# Altium footprint library microbuilder.PCBLIB: 422 footprints (part 12 of 27)
Each footprint in its own frame and in the unit in brackets; x right, y up, seen from the top. Pads: shape width x height; smd on the part's side, far side on the other; paste and mask are expansions set on the pad; w line width, h text height; cw(c..) or ccw(c..) is an arc to the next point about the centre after c.
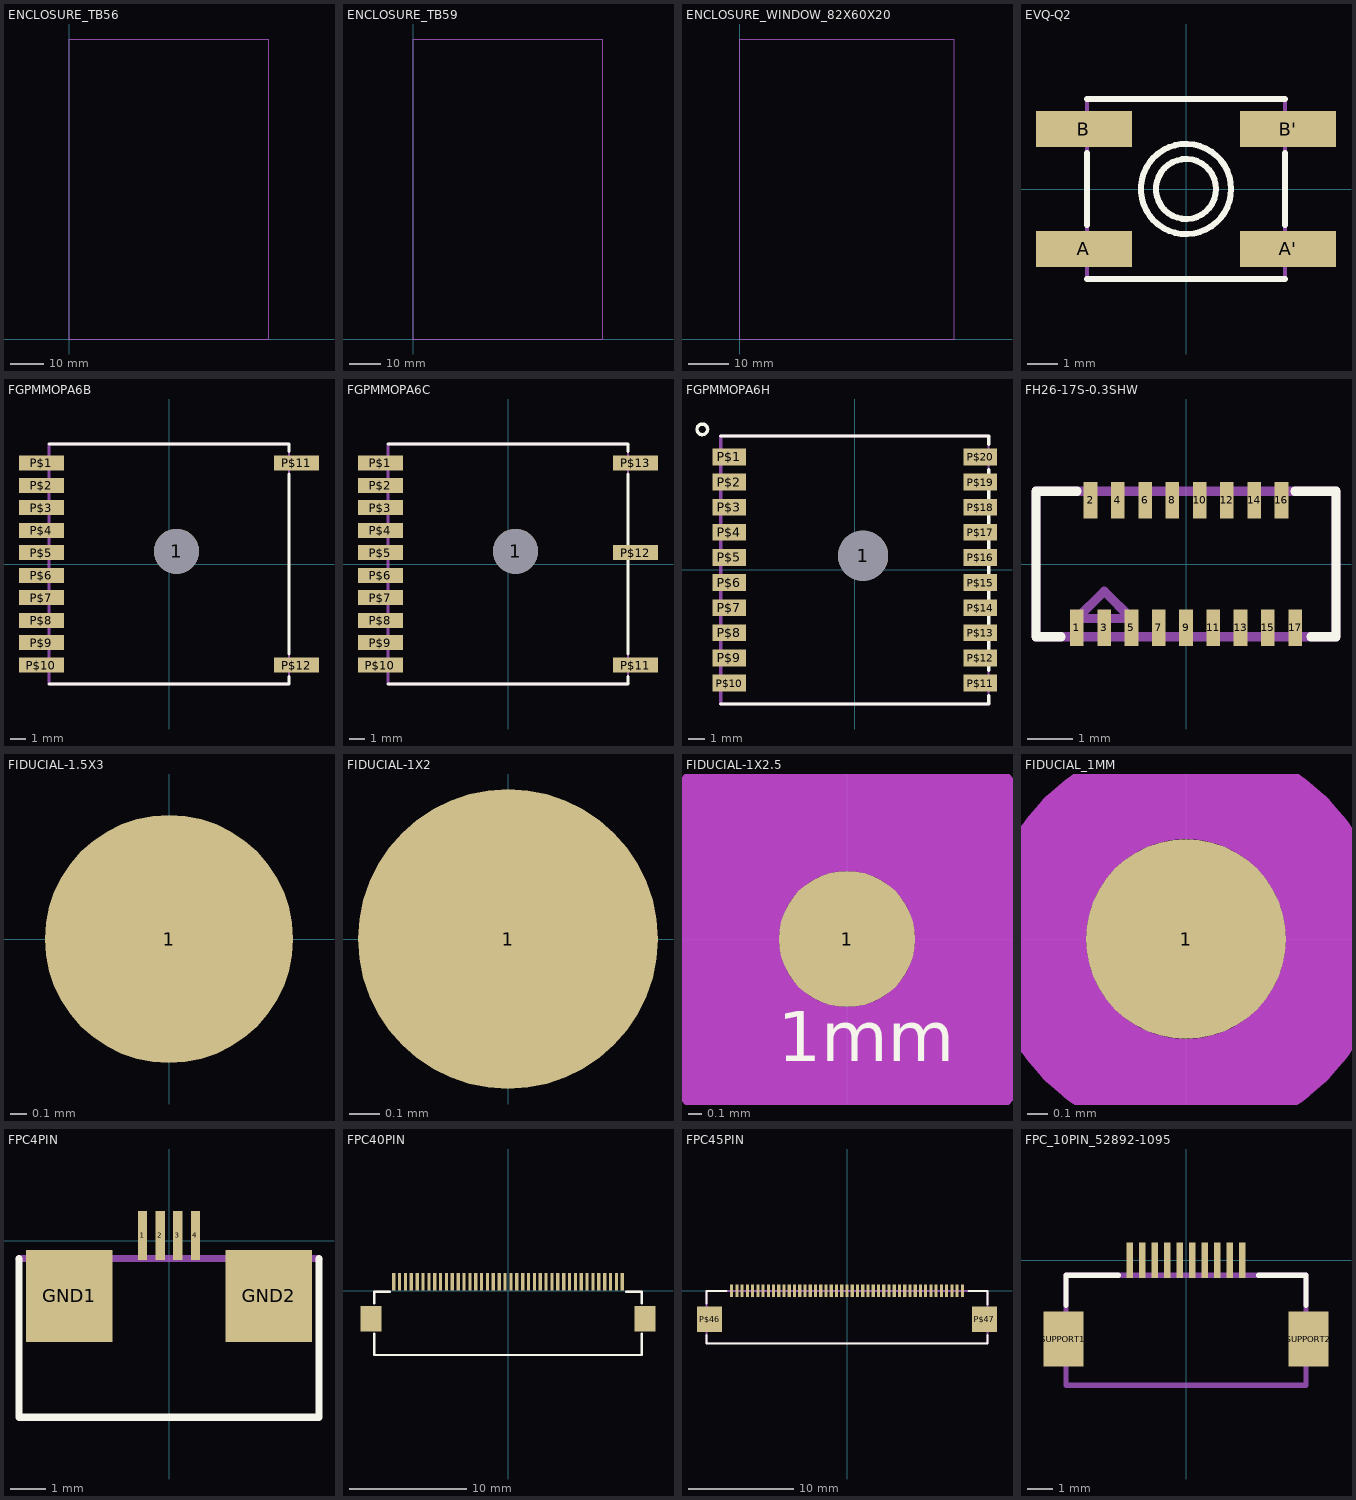
[diagram p11: the footprints below, top view; thin cyan lines are the x and y axes]

## ENCLOSURE_TB56 [mm]
Mechanical 1:
  lines w0: 0,0 0,90 60,90 60,0 0,0

## ENCLOSURE_TB59 [mm]
Mechanical 1:
  lines w0: 0,0 0,95 60,95 60,0 0,0

## ENCLOSURE_WINDOW_82X60X20 [mm]
Mechanical 1:
  lines w0: 0,0 0,74 53,74 53,0 0,0

## EVQ-Q2 [mm]
pads (4):
  rect 3.2x1.2 smd: A(-3.4,-2) A'(3.4,-2) B(-3.4,2) B'(3.4,2)
Top Overlay:
  circle w0.203: c0,0 r1
  circle w0.203: c0,0 r1.503
  lines w0.203: -3.3,-3 3.3,-3 ; -3.3,-1.2 -3.3,1.2 ; -3.3,3 3.3,3 ; 3.3,-1.2 3.3,1.2
Mechanical 16:
  lines w0.127: -3.3,-3 -3.3,3 ; 3.3,-3 3.3,3

## FGPMMOPA6B [mm]
pads (13):
  round 3 hole 3: 1(0.5,0.85)
  rect 3x1 smd: P$1(-8.5,6.75) P$2(-8.5,5.25) P$3(-8.5,3.75) P$4(-8.5,2.25) P$5(-8.5,0.75) P$6(-8.5,-0.75) P$7(-8.5,-2.25) P$8(-8.5,-3.75) P$9(-8.5,-5.25) P$10(-8.5,-6.75) P$11(8.5,6.75) P$12(8.5,-6.75)
Top Overlay:
  lines w0.203: -8,-8 8,-8 8,-7.5 ; -8,8 8,8 8,7.5 ; 8,-6 8,6
Mechanical 16:
  circle w0.813: c0.5,0.85 r0.5
  lines w0.127: 8,-8 8,8
  lines w0.203: 8,-8 -8,-8 -8,8 8,8

## FGPMMOPA6C [mm]
pads (14):
  round 3 hole 3: 1(0.5,0.85)
  rect 3x1 smd: P$1(-8.5,6.75) P$2(-8.5,5.25) P$3(-8.5,3.75) P$4(-8.5,2.25) P$5(-8.5,0.75) P$6(-8.5,-0.75) P$7(-8.5,-2.25) P$8(-8.5,-3.75) P$9(-8.5,-5.25) P$10(-8.5,-6.75) P$11(8.5,-6.75) P$12(8.5,0.75) P$13(8.5,6.75)
Top Overlay:
  lines w0.203: -8,-8 8,-8 8,-7.5 ; -8,8 8,8 8,7.5 ; 8,-6 8,6
Mechanical 16:
  circle w0.813: c0.5,0.85 r0.5
  lines w0.127: 8,-8 8,8
  lines w0.203: 8,-8 -8,-8 -8,8 8,8

## FGPMMOPA6H [mm]
pads (21):
  round 3 hole 3: 1(0.5,0.85)
  rect 2x1 smd: P$1(-7.5,6.75) P$2(-7.5,5.25) P$3(-7.5,3.75) P$4(-7.5,2.25) P$5(-7.5,0.75) P$6(-7.5,-0.75) P$7(-7.5,-2.25) P$8(-7.5,-3.75) P$9(-7.5,-5.25) P$10(-7.5,-6.75) P$11(7.5,-6.75) P$12(7.5,-5.25) P$13(7.5,-3.75) P$14(7.5,-2.25) P$15(7.5,-0.75) P$16(7.5,0.75) P$17(7.5,2.25) P$18(7.5,3.75) P$19(7.5,5.25) P$20(7.5,6.75)
Top Overlay:
  circle w0.203: c-9.1,8.4 r0.316
  lines w0.203: -8,-8 8,-8 8,-7.5 ; -8,8 8,8 8,7.5 ; 8,-6 8,6
Mechanical 16:
  circle w0.813: c0.5,0.85 r0.5
  lines w0.127: 8,-8 8,8
  lines w0.203: 8,-8 -8,-8 -8,8 8,8

## FH26-17S-0.3SHW [mil]
pads (17):
  rect 11.81x31.5 smd: 1(-94.49,-55.12) 2(-82.68,55.12) 3(-70.87,-55.12) 4(-59.06,55.12) 5(-47.24,-55.12) 6(-35.43,55.12) 7(-23.62,-55.12) 8(-11.81,55.12) 9(0,-55.12) 10(11.81,55.12) 11(23.62,-55.12) 12(35.43,55.12) 13(47.24,-55.12) 14(59.06,55.12) 15(70.87,-55.12) 16(82.68,55.12) 17(94.49,-55.12)
Top Overlay:
  lines w8: -108.27,-62.99 -129.92,-62.99 -129.92,62.99 -94.49,62.99 ; 94.49,62.99 129.92,62.99 129.92,-62.99 108.27,-62.99
Mechanical 16:
  lines w8: -129.92,-62.99 -129.92,62.99 129.92,62.99 129.92,-62.99 -129.92,-62.99 ; -94.49,-47.24 -70.87,-23.62 -47.24,-47.24 -94.49,-47.24
  text "HRS" at -37.8,-44.49 h37.2

## FIDUCIAL-1.5X3 [mm]
pads (1):
  rrect100% 1.5x1.5 smd: 1(0,0)
Top Solder:
  circle w1.27: c0,0 r0.906
  circle w1.27: c0,0 r0.906

## FIDUCIAL-1X2 [mm]
pads (1):
  rrect100% 1x1 smd: 1(0,0)

## FIDUCIAL-1X2.5 [mm]
pads (1):
  rrect100% 1x1 smd: 1(0,0)
Top Overlay:
  text "1mm" at -0.508,-1.016 h0.63
Top Solder:
  circle w1.2: c0,0 r1.1
Mechanical 8 keep-out:
  circle w1.2: c0,0 r1.1
Mechanical 27:
  circle w1.2: c0,0 r1.1

## FIDUCIAL_1MM [mm]
pads (1):
  rrect100% 1x1 smd: 1(0,0)
Top Solder:
  lines w0.5: -0.75,0 ccw(c0,0) 0,-0.75 ccw(c0,0) 0.75,0 ccw(c0,0) 0,0.75 ccw(c0,0) -0.75,0
Mechanical 8 keep-out:
  lines w0.5: -0.75,0 ccw(c0,0) 0,-0.75 ccw(c0,0) 0.75,0 ccw(c0,0) 0,0.75 ccw(c0,0) -0.75,0
Mechanical 27:
  lines w0.5: -0.75,0 ccw(c0,0) 0,-0.75 ccw(c0,0) 0.75,0 ccw(c0,0) 0,0.75 ccw(c0,0) -0.75,0

## FPC4PIN [mm]
pads (6):
  rect 0.26x1.4 smd: 1(-0.75,0.15) 2(-0.25,0.15) 3(0.25,0.15) 4(0.75,0.15)
  rect 2.45x2.6 smd: GND1(-2.825,-1.565) GND2(2.83,-1.565)
Top Overlay:
  lines w0.203: -4.25,-4.5 -4.25,-5 3.8,-5 ; -4.25,-4.45 -4.25,-0.5 ; 3.85,-5 4.25,-5 4.25,-4.6 ; 4.25,-4.55 4.25,-0.5
Mechanical 16:
  lines w0.127: -4.25,-0.5 -4.25,-5 4.25,-5 4.25,-0.5
  lines w0.203: -4.25,-0.5 4.25,-0.5

## FPC40PIN [mm]
pads (42):
  rect 0.275x1.5 smd: P$1(-9.75,0.75) P$2(-9.25,0.75) P$3(-8.75,0.75) P$4(-8.25,0.75) P$5(-7.75,0.75) P$6(-7.25,0.75) P$7(-6.75,0.75) P$8(-6.25,0.75) P$9(-5.75,0.75) P$10(-5.25,0.75) P$11(-4.75,0.75) P$12(-4.25,0.75) P$13(-3.75,0.75) P$14(-3.25,0.75) P$15(-2.75,0.75) P$16(-2.25,0.75) P$17(-1.75,0.75) P$18(-1.25,0.75) P$19(-0.75,0.75) P$20(-0.25,0.75) P$21(0.25,0.75) P$22(0.75,0.75) P$23(1.25,0.75) P$24(1.75,0.75) P$25(2.25,0.75) P$26(2.75,0.75) P$27(3.25,0.75) P$28(3.75,0.75) P$29(4.25,0.75) P$30(4.75,0.75) P$31(5.25,0.75) P$32(5.75,0.75) P$33(6.25,0.75) P$34(6.75,0.75) P$35(7.25,0.75) P$36(7.75,0.75) P$37(8.25,0.75) P$38(8.75,0.75) P$39(9.25,0.75) P$40(9.75,0.75)
  rect 1.8x2.2 smd: SUPPORT1(-11.7,-2.4) SUPPORT2(11.7,-2.4)
Top Overlay:
  lines w0.203: -11.4,-3.7 -11.4,-5.5 11.4,-5.5 11.4,-3.7 ; -11.4,-1.1 -11.4,-0.1 -10.1,-0.1 ; 10.1,-0.1 11.4,-0.1 11.4,-1.1

## FPC45PIN [mm]
pads (47):
  rect 0.3x1.2 smd: P$1(-11,0) P$2(-10.5,0) P$3(-10,0) P$4(-9.5,0) P$5(-9,0) P$6(-8.5,0) P$7(-8,0) P$8(-7.5,0) P$9(-7,0) P$10(-6.5,0) P$11(-6,0) P$12(-5.5,0) P$13(-5,0) P$14(-4.5,0) P$15(-4,0) P$16(-3.5,0) P$17(-3,0) P$18(-2.5,0) P$19(-2,0) P$20(-1.5,0) P$21(-1,0) P$22(-0.5,0) P$23(0,0) P$24(0.5,0) P$25(1,0) P$26(1.5,0) P$27(2,0) P$28(2.5,0) P$29(3,0) P$30(3.5,0) P$31(4,0) P$32(4.5,0) P$33(5,0) P$34(5.5,0) P$35(6,0) P$36(6.5,0) P$37(7,0) P$38(7.5,0) P$39(8,0) P$40(8.5,0) P$41(9,0) P$42(9.5,0) P$43(10,0) P$44(10.5,0) P$45(11,0)
  rect 2.4x2.4 smd: P$46(-13.1,-2.7) P$47(13.1,-2.7)
Top Overlay:
  lines w0.203: -13.4,-4.2 -13.4,-5 13.4,-5 13.4,-4.2 ; -13.4,-1.2 -13.4,0 -11.5,0 ; 11.6,0 13.4,0 13.4,-1.3
Mechanical 16:
  lines w0.127: -13.4,-5 13.4,-5
  lines w0.203: -13.4,-5 -13.4,0 13.4,0 13.4,-5

## FPC_10PIN_52892-1095 [mm]
pads (12):
  rect 0.25x1.4 smd: P$1(-2.25,0) P$2(-1.75,0) P$3(-1.25,0) P$4(-0.75,0) P$5(-0.25,0) P$6(0.25,0) P$7(0.75,0) P$8(1.25,0) P$9(1.75,0) P$10(2.25,0)
  rect 1.6x2.2 smd: SUPPORT1(-4.9,-3.15) SUPPORT2(4.9,-3.15)
Top Overlay:
  lines w0.203: -4.8,-1.8 -4.8,-0.6 -2.7,-0.6 ; 2.9,-0.6 4.8,-0.6 4.8,-1.8
Mechanical 16:
  lines w0.203: -4.8,-5 -4.8,-0.6 4.8,-0.6 4.8,-5 -4.8,-5